# Altium integrated library Digital.IntLib: 65 symbols (part 1 of 3) (continued)
## EP4CE15F17C8
designator D?
FPGA; Manufacturer: Altera; Model: EP4CE15F17C8; HelpURL: https://www.digikey.com/product-detail/en/altera/EP4CE15F17C8N/544-2808-ND/2288302; ComponentKind: 256-FBGA
footprint 256-FBGA (BGA, 256-Leads, Body 17x17mm, Pitch 1mm)
part A pins: B1 IO, DIFFIO_L3P (io), C2 IO, DIFFIO_L4P (io), D1 IO, DIFFIO_L6N (io), F1 IO, DIFFIO_L10N (io), F2 IO, DIFFIO_L10P (io), F3 IO, VREFB1N0 (io), G1 IO, VREFB1N1 (io), G2 IO, DPCLK0 (io), G5 IO, DIFFIO_L9N (io), J1 IO, DIFFIO_L14N, J2 IO, DIFFIO_L14P, K1 IO, DIFFIO_L18N, K2 IO, VREFB2N1, K5 IO, RUP1, K6 IO, DIFFIO_L16P, K9 IO, DIFFI_B19P, K10 IO, DIFFIO_B24N, L1 IO, DIFFIO_L19N, L2 IO, DIFFIO_L19P, L3 IO, VREFB2N0, L4 IO, RDN1, L6 IO, DIFFIO_L16N, L7 IO, DQ3B, L8 IO, DQ3B, L9 IO, DIFFI_B19N, L10 IO, L11 IO, DIFFIO_B31P, M6 IO, DIFFIO_B8P, M7 IO, DPCLK2, M8 IO, DIFFIO_B18P, M9 IO, DIFFI_B20P, M10 IO, RUP2, M11 IO, DIFFIO_B31N, N1 IO, DIFFIO_L27N, N2 IO, DIFFIO_L27P, N3 IO, DIFFIO_B3P, N5 IO, DIFFIO_B7P, N6 IO, DIFFIO_B7N, N8 IO, DIFFIO_B18N, N9 IO, DIFFI_B20N, N11 IO, RDN2, N12 IO, VREFB4N1, P1 IO, DIDDIO_L29N, P2 IO, DIDDIO_L29P, P3 IO, DIFFIO_B3N, P6 IO, VREFB3N0, P8 IO, DQ5B, P9 IO, DPCLK5, P11 IO, VREFB4N0, P14 IO, PLL4_CLKOUTp, R1 IO,DQS3L, R3 IO, DIFFIO_B4N, R4 IO, PLL1_CLKOUTp, R5 IO, DIFFIO_B14P, R6 IO, DIFFIO_B15P, R7 IO, DIFFIO_B16P, R10 IO, DIFFI_B21P, R11 IO, DIFFI_B22P, R12 IO, DIFFIO_B23P, R13 IO, DIFFIO_B26P, R14 IO, PLL4_CLKOUTn, T2 IO, CDPCLK2, T3 IO, VREFB3N1, T4 IO, PLL1_CLKOUTn, T5 IO, DIFFIO_B14N, T6 IO, DIFFIO_B15N, T7 IO, DIFFIO_B16N, T10 IO, DIFFI_B21N, T11 IO, DIFFI_B22N, T12 IO, DIFFIO_B24P, T13 IO, DIFFIO_B26N, T14 IO, DIFFIO_B29P, T15 IO, DIFFIO_B29N
part B pins: A2 IO, VREFB8N1 (io), A3 IO, DIFFIO_T2N (io), A4 IO, DIFFIO_T3N (io), A5 IO, DATA7 (io), A6 IO, DIFFIO_T9N (io), A7 IO, DIFFIO_T11N (io), A10 IO, DIFFIO_T20N (io), A11 IO, DIFFIO_T25N (io), A12 IO, DIFFIO_T27P (io), A13 IO, VREFB7N1 (io), A14 IO, PLL2_CLKOUTn (io), A15 IO, DIFFIO_T23N (io), B3 IO, DIFFIO_T2P (io), B4 IO, DIFFIO_T3P (io), B5 IO, DIFFIO_T5P (io), B6 IO, DIFFIO_T9P (io), B7 IO, DIFFIO_T11P (io), B10 IO, DIFFIO_T20P (io), B11 IO, DIFFIO_T25P (io), B12 IO, DIFFIO_T26N (io), B13 IO, DIFFIO_T29N (io), B14 IO, PLL2_CLKOUTp (io), B16 IO, DIFFIO_R15N, C3 IO, PLL3_CLKOUTn (io), C6 IO, VREFB8N0 (io), C8 IO, DIFFIO_T13P (io), C9 IO, DIFFIO_T19N (io), C11 IO, VREFB7N0 (io), C14 IO, DIFFIO_T32N (io), C15 IO, DIFFIO_R2P, C16 IO, DIFFIO_R2N, D3 IO, PLL3_CLKOUTp (io), D5 IO (io), D6 IO, DIFFIO_T4N (io), D8 IO, DQ3T (io), D9 IO, DIFFIO_T19P (io), D11 IO, DIFFIO_T30N (io), D12 IO, DIFFIO_T30P (io), D14 IO, DIFFIO_T32P (io), D15 IO, DIFFIO_R7P, D16 IO, DIFFIO_R7N, E6 IO, DIFFIO_T6P (io), E7 IO, DATA5 (io), E8 IO, DIFFIO_T12N (io), E9 IO, DIFFIO_T17P (io), E10 IO, RDN4 (io), E11 IO, RUP4 (io), F8 IO, DIFFIO_T12P (io), F9 IO, DIFFIO_T21P (io), F13 IO, VREFB6N1, F14 IO, VREFB6N0, F15 IO, DIFFIO_R16P, F16 IO, DIFFIO_R16N, G11 IO, DIFFIO_R3P, G15 IO, DIFFIO_R17P, G16 IO, DIFFIO_R17N, J12 IO, DFFIO_R19P, J13 IO, DQ1R, J14 IO, DFFIO_R19N, J15 IO, DFFIO_R21P, J16 IO, DFFIO_R21N, K12 IO, DIFFIO_R35P, K15 IO, DFFIO_R22P, K16 IO, DFFIO_R22N, L13 IO, DIFFIO_R26N, L14 IO, VREFB5N1, L15 IO, VREFB5N0, L16 IO, DIFFIO_R26P, N14 IO, RUP3, N15 IO, DIFFIO_R31P, N16 IO, DIFFIO_R31N, P15 IO, RDN3, P16 IO, DIFFIO_R34N, R16 IO, DIFFIO_R34P
part C pins: A8 CLK10, DIFFCLK_4N (in), A9 CLK8, DIFFCLK_5N (in), B8 CLK11, DIFFCLK_4P (in), B9 CLK9, DIFFCLK_5P (in), E1 CLK1, DIFFCLK_0n (in), E15 CLK4, DIFFCLK_2P (in), E16 CLK5, DIFFCLK_2N (in), M1 CLK3, DIFFCLK_1N (in), M2 CLK2, DIFFCLK_1p (in), M15 CLK6, DIFFCLK_3P (in), M16 CLK7, DIFFCLK_3N (in), R8 CLK15, DIFFCLK_6P (in), R9 CLK13, DIFFCLK_7P (in), T8 CLK14, DIFFCLK_6N (in), T9 CLK12, DIFFCLK_7N (in)
part D pins: C1 ASDO, D2 nCSO, F4 nSTATUS, G12 MSEL2 (in), H1 DCLK, H2 DATA0, H3 TCK (in), H4 TDI (in), H5 nCONFIG, H12 MSEL1 (in), H13 MSEL0 (in), H14 CONF_DONE, J3 nCE, J4 TDO (in), J5 TMS (in)
part E pins: A1 VCCIO8, A16 VCCIO7, B2 GND, B15 GND, C4 VCCIO8, C5 GND, C7 VCCIO8, C10 VCCIO7, C12 GND, C13 VCCIO7, D4 VCCD_PLL3, D7 GND, D10 GND, D13 VCCD_PLL2, E2 GND, E3 VCCIO1, E4 GND, E5 GNDA3, E12 GNDA2, E13 GND, E14 VCCIO6, F5 VCCA3, F6 GND, F7 VCCINT, F10 GND, F11 VCCINT, F12 VCCA2, G3 VCCIO1, G4 GND, G6 VCCINT, G7 VCCINT, G8 VCCINT, G9 VCCINT, G10 VCCINT, G13 GND, G14 VCCIO6, H6 VCCINT, H7 GND, H8 GND, H9 GND, H10 GND, H11 VCCINT, H15 GND, H16 GND, J6 VCCINT, J7 GND, J8 GND, J9 GND, J10 GND, J11 GND, K3 VCCIO2, K4 GND, K7 VCCINT, K8 GND, K11 VCCINT, K13 GND, K14 VCCIO5, L5 VCCA1, L12 VCCA4, M3 VCCIO2, M4 GND, M5 GNDA1, M12 GNDA4, M13 GND, M14 VCCIO5, N4 VCCD_PLL1, N7 GND, N10 GND, N13 VCCD_PLL4, P4 VCCIO3, P5 GND, P7 VCCIO3, P10 VCCIO4, P12 GND, P13 VCCIO4, R2 GND, R15 GND, T1 VCCIO3, T16 VCCIO4
part A text: I; II; IV; III
part B text: V; VI; VII; VIII
part E text: Core; I; II; III; IV; V; VI; VII; VIII

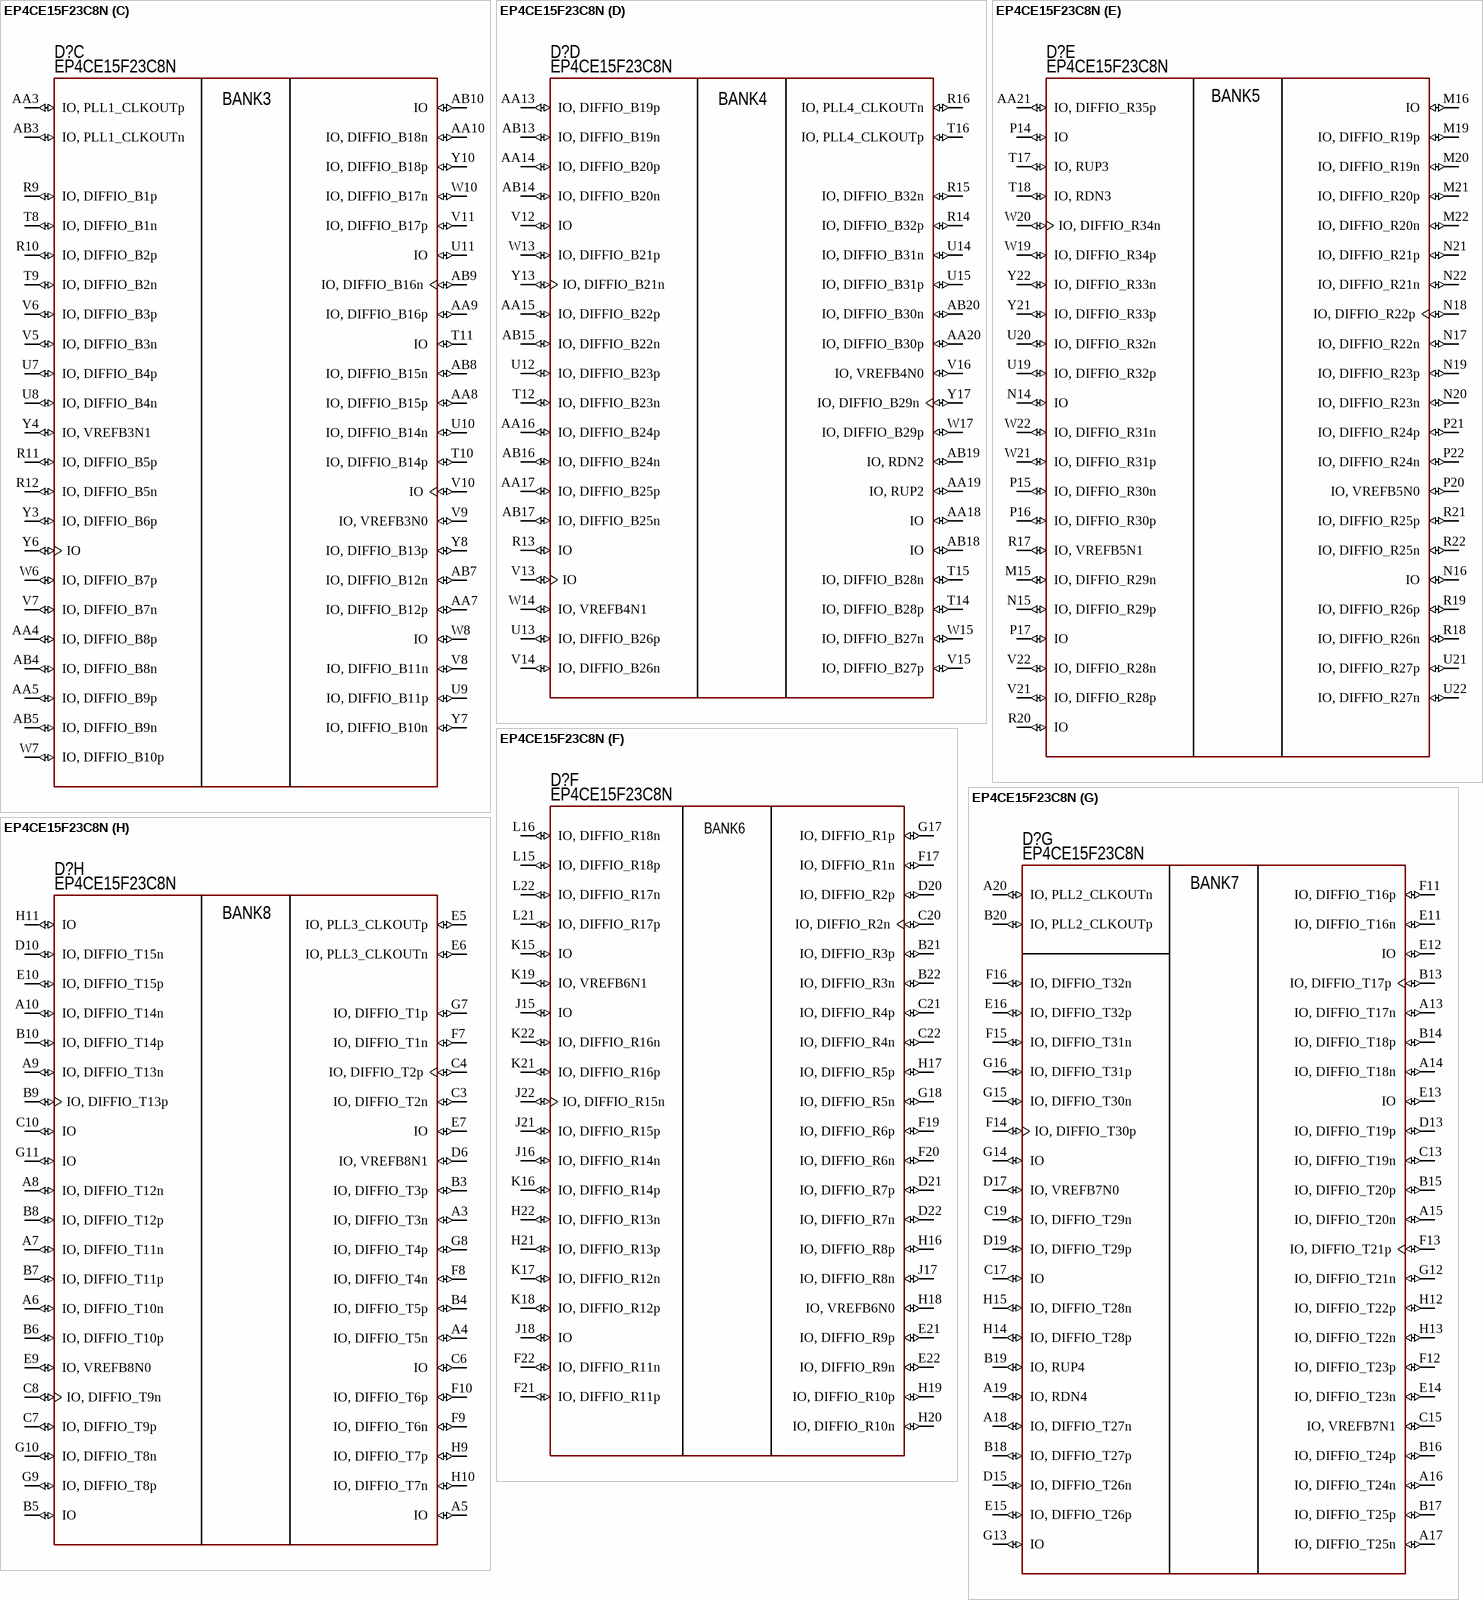
[diagram p5: symbol EP4CE15F23C8N]

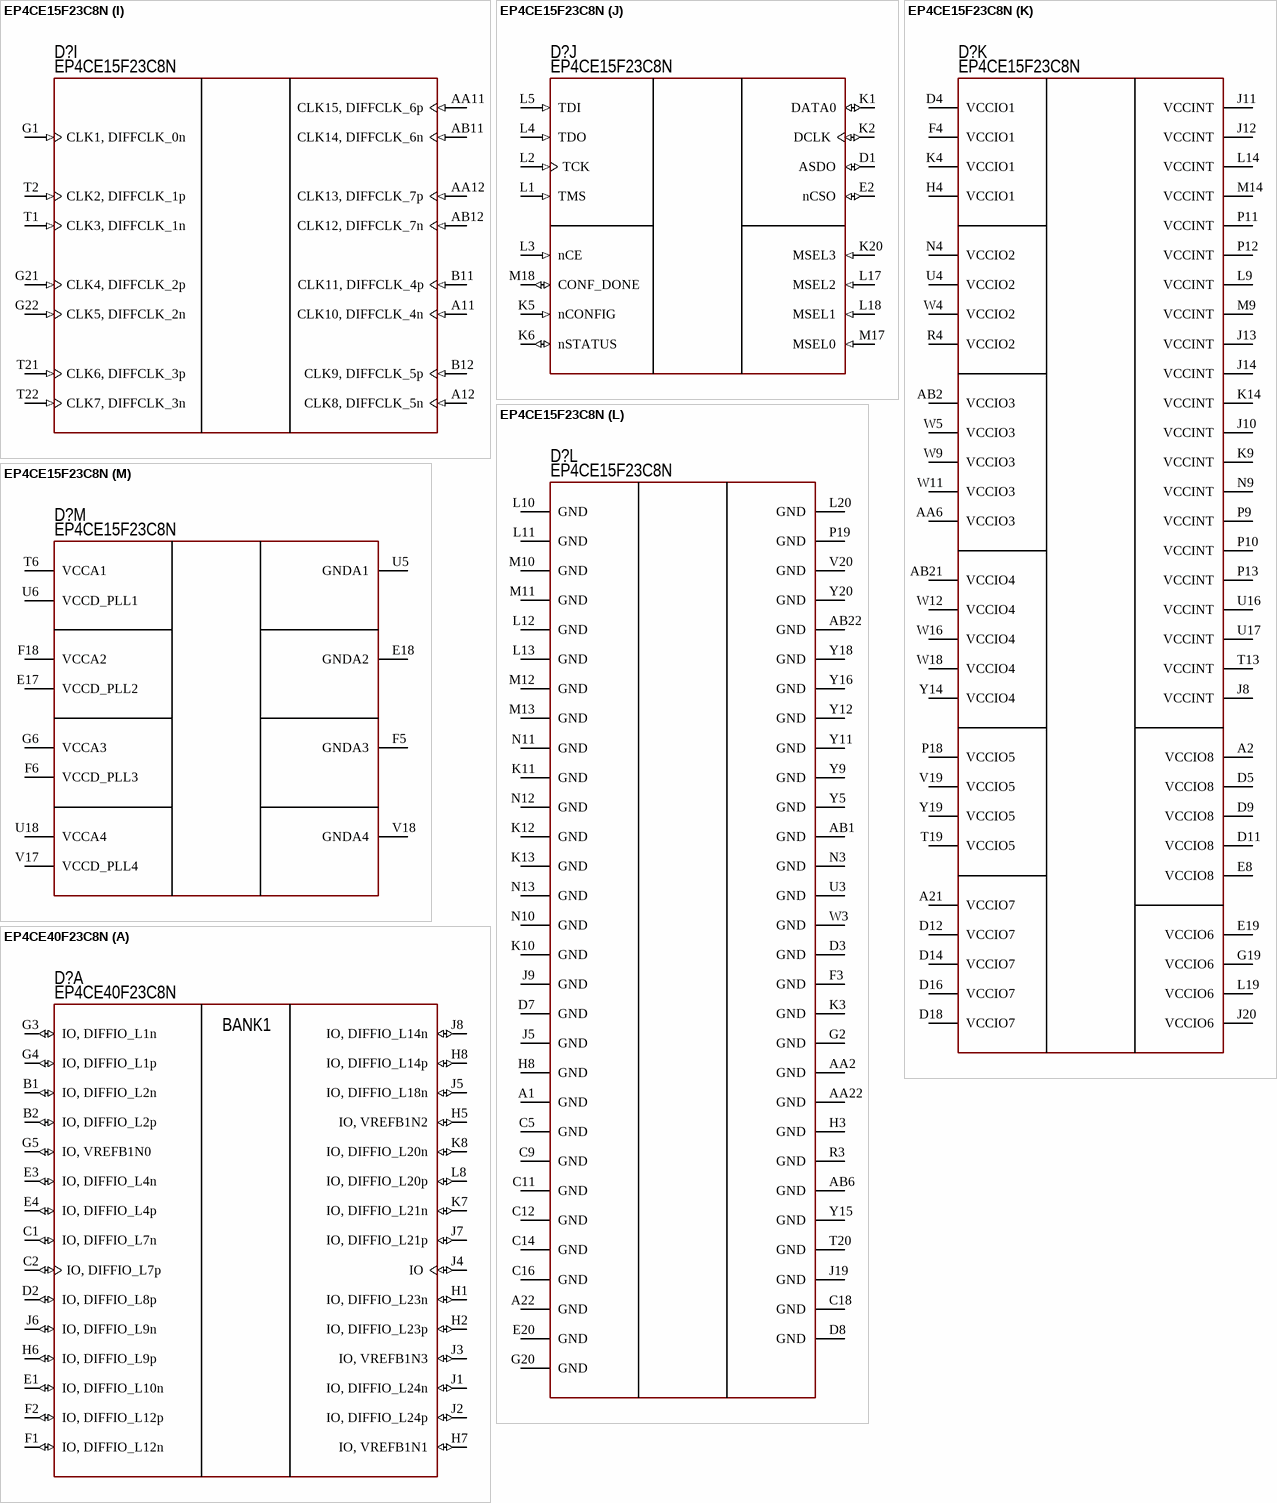
[diagram p6: symbols EP4CE15F23C8N to EP4CE40F23C8N]

## EP4CE15F23C8N
designator D?
FPGA; Manufacturer: Altera; HelpURL: https://www.digikey.com/products/en?keywords=EP4CE15F23C8N; ComponentKind: 484-FBGA; Model: EP4CE15F23C8N
footprint 484-FBGA (BGA, 484-Leads, Body 23x23mm, Pitch 1mm)
part A pins: B1 IO, DIFFIO_L1n (io), B2 IO, DIFFIO_L1p, (io), C1 IO, DIFFIO_L3n (io), C2 IO, DIFFIO_L3p (io), D2 IO, DIFFIO_L4p (io), E1 IO, DIFFIO_L6n (io), E3 IO, DIFFIO_L2n (io), E4 IO, DIFFIO_L2p (io), F1 IO, DIFFIO_L7n (io), F2 IO, DIFFIO_L7p (io), G3 IO, DIFFIO_L8n (io), G4 IO, DIFFIO_L8p (io), G5 IO (io), H1 IO, DIFFIO_L11n (io), H2 IO, DIFFIO_L11p (io), H5 IO (io), H6 IO, DIFFIO_L5p (io), H7 IO, VREFB1N0 (io), J1 IO, DIFFIO_L12n (io), J2 IO, DIFFIO_L12p (io), J3 IO, VREFB1N1 (io), J4 IO, DPCLK0 (io), J6 IO, DIFFIO_L5n (io), J7 IO, DIFFIO_L10p (io), K7 IO, DIFFIO_L10n (io), K8 IO, DIFFIO_L9n (io), L8 IO, DIFFIO_L9p (io)
part B pins: AA1 IO, DIFFIO_L27n (io), L6 IO, DIFFIO_L13p (io), L7 IO (io), M1 IO, DIFFIO_L14n (io), M2 IO, DIFFIO_L14p (io), M3 IO, DIFFIO_L15n (io), M4 IO, DIFFIO_L15p (io), M5 IO, VREFB2N0 (io), M6 IO, DIFFIO_L13n (io), M7 IO, DIFFIO_L22n (io), M8 IO, DIFFIO_L23p (io), N1 IO, DIFFIO_L16n (io), N2 IO, DIFFIO_L16p (io), N5 IO (io), N6 IO, DIFFIO_L22p (io), N7 IO, DIFFIO_L26p (io), N8 IO, DIFFIO_L23n (io), P1 IO, DIFFIO_L17n (io), P2 IO, DIFFIO_L17p (io), P3 IO, DIFFIO_L19n (io), P4 IO, DIFFIO_L19p (io), P5 IO (io), P6 IO, DIFFIO_L28p (io), P7 IO, DIFFIO_L26n (io), P8 IO, DIFFIO_L31p (io), R1 IO, DIFFIO_L18n (io), R2 IO, DIFFIO_L18p (io), R5 IO, DIFFIO_L28n (io), R6 IO, DIFFIO_L29n (io), R7 IO, DIFFIO_L30p (io), R8 IO, DIFFIO_L31n (io), T3 IO, VREFB2N1 (io), T4 IO (io), T5 IO, DIFFIO_L29p (io), T7 IO, DIFFIO_L30n (io), U1 IO, DIFFIO_L20n (io), U2 IO, DIFFIO_L20p (io), V1 IO, DIFFIO_L21n (io), V2 IO, DIFFIO_L21p (io), V3 IO, RDN1 (io), V4 IO, RUP1 (io), W1 IO, DIFFIO_L24n (io), W2 IO, DIFFIO_L24p (io), Y1 IO, DIFFIO_L25n (io), Y2 IO, DIFFIO_L25p (io)
part C pins: AA3 IO, PLL1_CLKOUTp (io), AA4 IO, DIFFIO_B8p (io), AA5 IO, DIFFIO_B9p (io), AA7 IO, DIFFIO_B12p (io), AA8 IO, DIFFIO_B15p (io), AA9 IO, DIFFIO_B16p (io), AA10 IO, DIFFIO_B18n (io), AB3 IO, PLL1_CLKOUTn (io), AB4 IO, DIFFIO_B8n (io), AB5 IO, DIFFIO_B9n (io), AB7 IO, DIFFIO_B12n (io), AB8 IO, DIFFIO_B15n (io), AB9 IO, DIFFIO_B16n (io), AB10 IO (io), R9 IO, DIFFIO_B1p (io), R10 IO, DIFFIO_B2p (io), R11 IO, DIFFIO_B5p (io), R12 IO, DIFFIO_B5n (io), T8 IO, DIFFIO_B1n (io), T9 IO, DIFFIO_B2n (io), T10 IO, DIFFIO_B14p (io), T11 IO (io), U7 IO, DIFFIO_B4p (io), U8 IO, DIFFIO_B4n (io), U9 IO, DIFFIO_B11p (io), U10 IO, DIFFIO_B14n (io), U11 IO (io), V5 IO, DIFFIO_B3n (io), V6 IO, DIFFIO_B3p (io), V7 IO, DIFFIO_B7n (io), V8 IO, DIFFIO_B11n (io), V9 IO, VREFB3N0 (io), V10 IO (io), V11 IO, DIFFIO_B17p (io), W6 IO, DIFFIO_B7p (io), W7 IO, DIFFIO_B10p (io), W8 IO (io), W10 IO, DIFFIO_B17n (io), Y3 IO, DIFFIO_B6p (io), Y4 IO, VREFB3N1 (io), Y6 IO (io), Y7 IO, DIFFIO_B10n (io), Y8 IO, DIFFIO_B13p (io), Y10 IO, DIFFIO_B18p (io)
part D pins: AA13 IO, DIFFIO_B19p (io), AA14 IO, DIFFIO_B20p (io), AA15 IO, DIFFIO_B22p (io), AA16 IO, DIFFIO_B24p (io), AA17 IO, DIFFIO_B25p (io), AA18 IO (io), AA19 IO, RUP2 (io), AA20 IO, DIFFIO_B30p (io), AB13 IO, DIFFIO_B19n (io), AB14 IO, DIFFIO_B20n (io), AB15 IO, DIFFIO_B22n (io), AB16 IO, DIFFIO_B24n (io), AB17 IO, DIFFIO_B25n (io), AB18 IO (io), AB19 IO, RDN2 (io), AB20 IO, DIFFIO_B30n (io), R13 IO (io), R14 IO, DIFFIO_B32p (io), R15 IO, DIFFIO_B32n (io), R16 IO, PLL4_CLKOUTn (io), T12 IO, DIFFIO_B23n (io), T14 IO, DIFFIO_B28p (io), T15 IO, DIFFIO_B28n (io), T16 IO, PLL4_CLKOUTp (io), U12 IO, DIFFIO_B23p (io), U13 IO, DIFFIO_B26p (io), U14 IO, DIFFIO_B31n (io), U15 IO, DIFFIO_B31p (io), V12 IO (io), V13 IO (io), V14 IO, DIFFIO_B26n (io), V15 IO, DIFFIO_B27p (io), V16 IO, VREFB4N0 (io), W13 IO, DIFFIO_B21p (io), W14 IO, VREFB4N1 (io), W15 IO, DIFFIO_B27n (io), W17 IO, DIFFIO_B29p (io), Y13 IO, DIFFIO_B21n (io), Y17 IO, DIFFIO_B29n (io)
part E pins: AA21 IO, DIFFIO_R35p (io), M15 IO, DIFFIO_R29n (io), M16 IO (io), M19 IO, DIFFIO_R19p (io), M20 IO, DIFFIO_R19n (io), M21 IO, DIFFIO_R20p (io), M22 IO, DIFFIO_R20n (io), N14 IO (io), N15 IO, DIFFIO_R29p (io), N16 IO (io), N17 IO, DIFFIO_R22n (io), N18 IO, DIFFIO_R22p (io), N19 IO, DIFFIO_R23p (io), N20 IO, DIFFIO_R23n (io), N21 IO, DIFFIO_R21p (io), N22 IO, DIFFIO_R21n (io), P14 IO (io), P15 IO, DIFFIO_R30n (io), P16 IO, DIFFIO_R30p (io), P17 IO (io), P20 IO, VREFB5N0 (io), P21 IO, DIFFIO_R24p (io), P22 IO, DIFFIO_R24n (io), R17 IO, VREFB5N1 (io), R18 IO, DIFFIO_R26n (io), R19 IO, DIFFIO_R26p (io), R20 IO (io), R21 IO, DIFFIO_R25p (io), R22 IO, DIFFIO_R25n (io), T17 IO, RUP3 (io), T18 IO, RDN3 (io), U19 IO, DIFFIO_R32p (io), U20 IO, DIFFIO_R32n (io), U21 IO, DIFFIO_R27p (io), U22 IO, DIFFIO_R27n (io), V21 IO, DIFFIO_R28p (io), V22 IO, DIFFIO_R28n (io), W19 IO, DIFFIO_R34p (io), W20 IO, DIFFIO_R34n (io), W21 IO, DIFFIO_R31p (io), W22 IO, DIFFIO_R31n (io), Y21 IO, DIFFIO_R33p (io), Y22 IO, DIFFIO_R33n (io)
part F pins: B21 IO, DIFFIO_R3p (io), B22 IO, DIFFIO_R3n (io), C20 IO, DIFFIO_R2n (io), C21 IO, DIFFIO_R4p (io), C22 IO, DIFFIO_R4n (io), D20 IO, DIFFIO_R2p (io), D21 IO, DIFFIO_R7p (io), D22 IO, DIFFIO_R7n (io), E21 IO, DIFFIO_R9p (io), E22 IO, DIFFIO_R9n (io), F17 IO, DIFFIO_R1n (io), F19 IO, DIFFIO_R6p (io), F20 IO, DIFFIO_R6n (io), F21 IO, DIFFIO_R11p (io), F22 IO, DIFFIO_R11n (io), G17 IO, DIFFIO_R1p (io), G18 IO, DIFFIO_R5n (io), H16 IO, DIFFIO_R8p (io), H17 IO, DIFFIO_R5p (io), H18 IO, VREFB6N0 (io), H19 IO, DIFFIO_R10p (io), H20 IO, DIFFIO_R10n (io), H21 IO, DIFFIO_R13p (io), H22 IO, DIFFIO_R13n (io), J15 IO (io), J16 IO, DIFFIO_R14n (io), J17 IO, DIFFIO_R8n (io), J18 IO (io), J21 IO, DIFFIO_R15p (io), J22 IO, DIFFIO_R15n (io), K15 IO (io), K16 IO, DIFFIO_R14p (io), K17 IO, DIFFIO_R12n (io), K18 IO, DIFFIO_R12p (io), K19 IO, VREFB6N1 (io), K21 IO, DIFFIO_R16p (io), K22 IO, DIFFIO_R16n (io), L15 IO, DIFFIO_R18p (io), L16 IO, DIFFIO_R18n (io), L21 IO, DIFFIO_R17p (io), L22 IO, DIFFIO_R17n (io)
part G pins: A13 IO, DIFFIO_T17n (io), A14 IO, DIFFIO_T18n (io), A15 IO, DIFFIO_T20n (io), A16 IO, DIFFIO_T24n (io), A17 IO, DIFFIO_T25n (io), A18 IO, DIFFIO_T27n (io), A19 IO, RDN4 (io), A20 IO, PLL2_CLKOUTn (io), B13 IO, DIFFIO_T17p (io), B14 IO, DIFFIO_T18p (io), B15 IO, DIFFIO_T20p (io), B16 IO, DIFFIO_T24p (io), B17 IO, DIFFIO_T25p (io), B18 IO, DIFFIO_T27p (io), B19 IO, RUP4 (io), B20 IO, PLL2_CLKOUTp (io), C13 IO, DIFFIO_T19n (io), C15 IO, VREFB7N1 (io), C17 IO (io), C19 IO, DIFFIO_T29n (io), D13 IO, DIFFIO_T19p (io), D15 IO, DIFFIO_T26n (io), D17 IO, VREFB7N0 (io), D19 IO, DIFFIO_T29p (io), E11 IO, DIFFIO_T16n (io), E12 IO (io), E13 IO (io), E14 IO, DIFFIO_T23n (io), E15 IO, DIFFIO_T26p (io), E16 IO, DIFFIO_T32p (io), F11 IO, DIFFIO_T16p (io), F12 IO, DIFFIO_T23p (io), F13 IO, DIFFIO_T21p (io), F14 IO, DIFFIO_T30p (io), F15 IO, DIFFIO_T31n (io), F16 IO, DIFFIO_T32n (io), G12 IO, DIFFIO_T21n (io), G13 IO (io), G14 IO (io), G15 IO, DIFFIO_T30n (io), G16 IO, DIFFIO_T31p (io), H12 IO, DIFFIO_T22p (io), H13 IO, DIFFIO_T22n (io), H14 IO, DIFFIO_T28p (io), H15 IO, DIFFIO_T28n (io)
part H pins: A3 IO, DIFFIO_T3n (io), A4 IO, DIFFIO_T5n (io), A5 IO (io), A6 IO, DIFFIO_T10n (io), A7 IO, DIFFIO_T11n (io), A8 IO, DIFFIO_T12n (io), A9 IO, DIFFIO_T13n (io), A10 IO, DIFFIO_T14n (io), B3 IO, DIFFIO_T3p (io), B4 IO, DIFFIO_T5p (io), B5 IO (io), B6 IO, DIFFIO_T10p (io), B7 IO, DIFFIO_T11p (io), B8 IO, DIFFIO_T12p (io), B9 IO, DIFFIO_T13p (io), B10 IO, DIFFIO_T14p (io), C3 IO, DIFFIO_T2n (io), C4 IO, DIFFIO_T2p (io), C6 IO (io), C7 IO, DIFFIO_T9p (io), C8 IO, DIFFIO_T9n (io), C10 IO (io), D6 IO, VREFB8N1 (io), D10 IO, DIFFIO_T15n (io), E5 IO, PLL3_CLKOUTp (io), E6 IO, PLL3_CLKOUTn (io), E7 IO (io), E9 IO, VREFB8N0 (io), E10 IO, DIFFIO_T15p (io), F7 IO, DIFFIO_T1n (io), F8 IO, DIFFIO_T4n (io), F9 IO, DIFFIO_T6n (io), F10 IO, DIFFIO_T6p (io), G7 IO, DIFFIO_T1p (io), G8 IO, DIFFIO_T4p (io), G9 IO, DIFFIO_T8p (io), G10 IO, DIFFIO_T8n (io), G11 IO (io), H9 IO, DIFFIO_T7p (io), H10 IO, DIFFIO_T7n (io), H11 IO (io)
part I pins: A11 CLK10, DIFFCLK_4n (in), A12 CLK8, DIFFCLK_5n (in), AA11 CLK15, DIFFCLK_6p (in), AA12 CLK13, DIFFCLK_7p (in), AB11 CLK14, DIFFCLK_6n (in), AB12 CLK12, DIFFCLK_7n (in), B11 CLK11, DIFFCLK_4p (in), B12 CLK9, DIFFCLK_5p (in), G1 CLK1, DIFFCLK_0n (in), G21 CLK4, DIFFCLK_2p (in), G22 CLK5, DIFFCLK_2n (in), T1 CLK3, DIFFCLK_1n (in), T2 CLK2, DIFFCLK_1p (in), T21 CLK6, DIFFCLK_3p (in), T22 CLK7, DIFFCLK_3n (in)
part J pins: D1 ASDO (io), E2 nCSO (io), K1 DATA0 (io), K2 DCLK (io), K5 nCONFIG (in), K6 nSTATUS (io), K20 MSEL3 (in), L1 TMS (in), L2 TCK (in), L3 nCE (in), L4 TDO (in), L5 TDI (in), L17 MSEL2 (in), L18 MSEL1 (in), M17 MSEL0 (in), M18 CONF_DONE (io)
part K pins: A2 VCCIO8 (power), A21 VCCIO7 (power), AA6 VCCIO3 (power), AB2 VCCIO3 (power), AB21 VCCIO4 (power), D4 VCCIO1 (power), D5 VCCIO8 (power), D9 VCCIO8 (power), D11 VCCIO8 (power), D12 VCCIO7 (power), D14 VCCIO7 (power), D16 VCCIO7 (power), D18 VCCIO7 (power), E8 VCCIO8 (power), E19 VCCIO6 (power), F4 VCCIO1 (power), G19 VCCIO6 (power), H4 VCCIO1 (power), J8 VCCINT (power), J10 VCCINT (power), J11 VCCINT (power), J12 VCCINT (power), J13 VCCINT (power), J14 VCCINT (power), J20 VCCIO6 (power), K4 VCCIO1 (power), K9 VCCINT (power), K14 VCCINT (power), L9 VCCINT (power), L14 VCCINT (power), L19 VCCIO6 (power), M9 VCCINT (power), M14 VCCINT (power), N4 VCCIO2 (power), N9 VCCINT (power), P9 VCCINT (power), P10 VCCINT (power), P11 VCCINT (power), P12 VCCINT (power), P13 VCCINT (power), P18 VCCIO5 (power), R4 VCCIO2 (power), T13 VCCINT (power), T19 VCCIO5 (power), U4 VCCIO2 (power), U16 VCCINT (power), U17 VCCINT (power), V19 VCCIO5 (power), W4 VCCIO2 (power), W5 VCCIO3 (power), W9 VCCIO3 (power), W11 VCCIO3 (power), W12 VCCIO4 (power), W16 VCCIO4 (power), W18 VCCIO4 (power), Y14 VCCIO4 (power), Y19 VCCIO5 (power)
part L pins: A1 GND (power), A22 GND (power), AA2 GND (power), AA22 GND (power), AB1 GND (power), AB6 GND (power), AB22 GND (power), C5 GND (power), C9 GND (power), C11 GND (power), C12 GND (power), C14 GND (power), C16 GND (power), C18 GND (power), D3 GND (power), D7 GND (power), D8 GND (power), E20 GND (power), F3 GND (power), G2 GND (power), G20 GND (power), H3 GND (power), H8 GND (power), J5 GND (power), J9 GND (power), J19 GND (power), K3 GND (power), K10 GND (power), K11 GND (power), K12 GND (power), K13 GND (power), L10 GND (power), L11 GND (power), L12 GND (power), L13 GND (power), L20 GND (power), M10 GND (power), M11 GND (power), M12 GND (power), M13 GND (power), N3 GND (power), N10 GND (power), N11 GND (power), N12 GND (power), N13 GND (power), P19 GND (power), R3 GND (power), T20 GND (power), U3 GND (power), V20 GND (power), W3 GND (power), Y5 GND (power), Y9 GND (power), Y11 GND (power), Y12 GND (power), Y15 GND (power), Y16 GND (power), Y18 GND (power), Y20 GND (power)
part M pins: E17 VCCD_PLL2 (power), E18 GNDA2 (power), F5 GNDA3 (power), F6 VCCD_PLL3 (power), F18 VCCA2 (power), G6 VCCA3 (power), T6 VCCA1 (power), U5 GNDA1 (power), U6 VCCD_PLL1 (power), U18 VCCA4 (power), V17 VCCD_PLL4 (power), V18 GNDA4 (power)

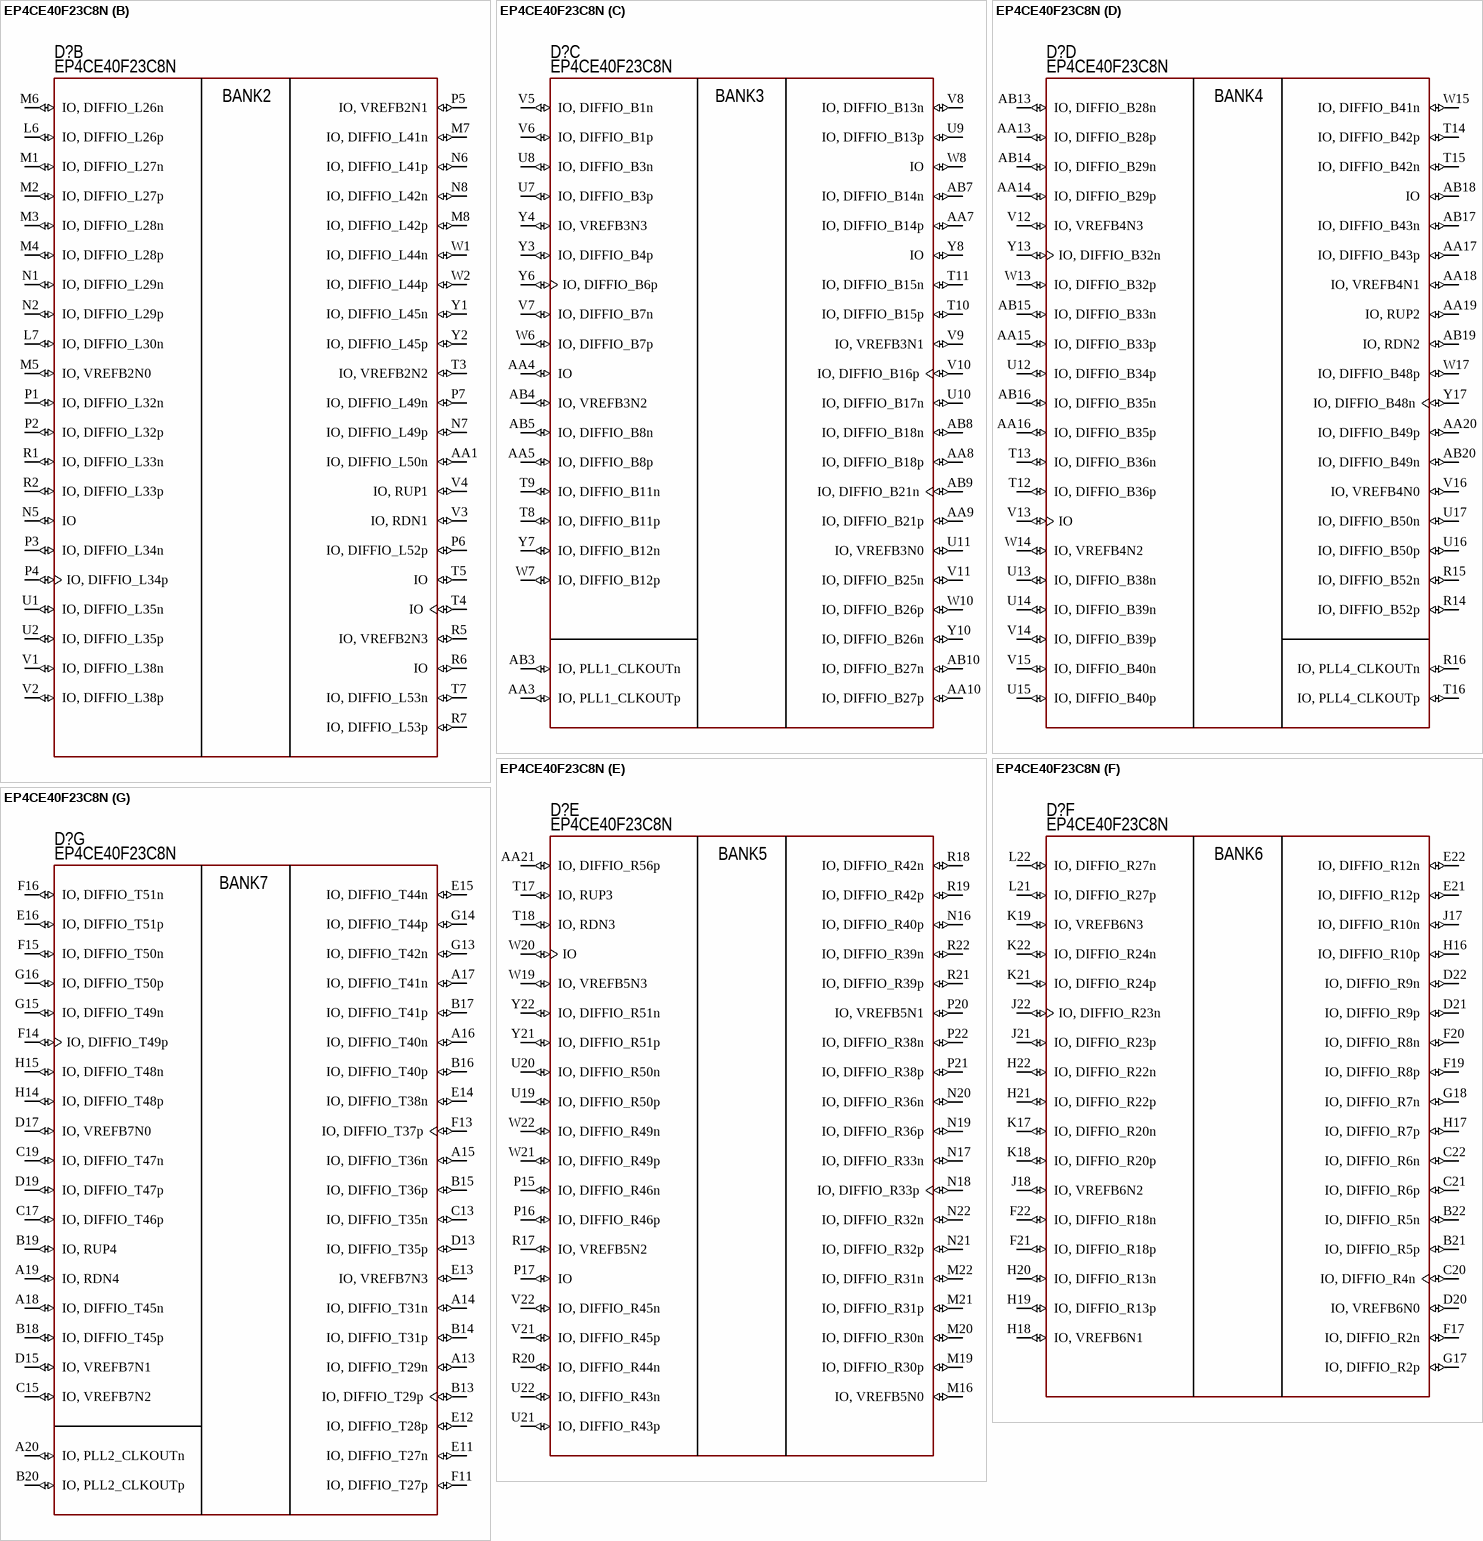
[diagram p7: symbol EP4CE40F23C8N]

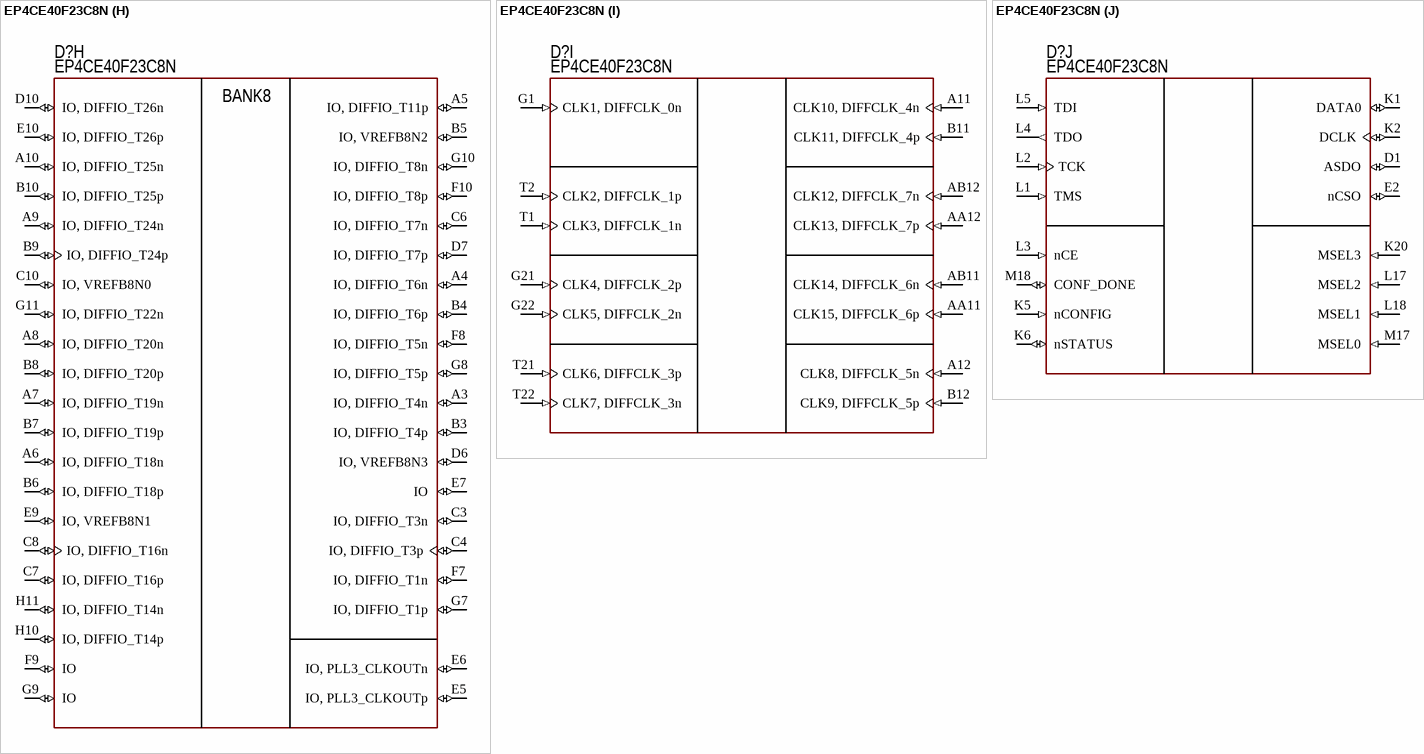
[diagram p8: symbol EP4CE40F23C8N]
